# Altium footprint library ComputeCores.PCBLIB: 18 footprints (part 2 of 2)
Each footprint in its own frame and in the unit in brackets; x right, y up, seen from the top. Pads: shape width x height; smd on the part's side, far side on the other; paste and mask are expansions set on the pad; w line width, h text height; cw(c..) or ccw(c..) is an arc to the next point about the centre after c.
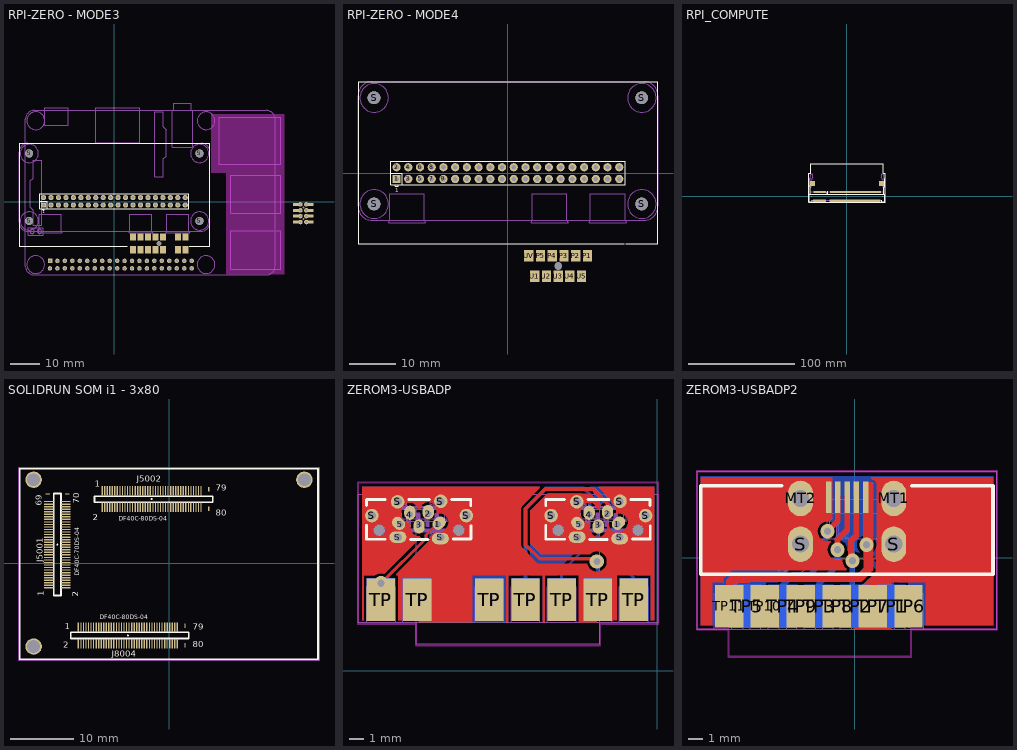
[diagram p1: the footprints below, top view; thin cyan lines are the x and y axes]

## RPI-ZERO - MODE3 [mil]
pads (117):
  rect 70x70 hole 39.37: 1(-949.27,-47.25)
  rect 60x60 hole 40: 1(-862.01,-795.39)
  round 70 hole 39.37: 2(-949.27,52.75) 3(-849.27,-47.25) 4(-849.27,52.75) 5(-749.27,-47.25) 6(-749.27,52.75) 7(-649.27,-47.25) 8(-649.27,52.75) 9(-549.27,-47.25) 10(-549.27,52.75) 11(-449.27,-47.25) 12(-449.27,52.75) 13(-349.27,-47.25) 14(-349.27,52.75) 15(-249.27,-47.25) 16(-249.27,52.75) 17(-149.27,-47.25) 18(-149.27,52.75) 19(-49.27,-47.25) 20(-49.27,52.75) 21(50.73,-47.25) 22(50.73,52.75) 23(150.73,-47.25) 24(150.73,52.75) 25(250.73,-47.25) 26(250.73,52.75) 27(350.73,-47.25) 28(350.73,52.75) 29(450.73,-47.25) 30(450.73,52.75) 31(550.73,-47.25) 32(550.73,52.75) 33(650.73,-47.25) 34(650.73,52.75) 35(750.73,-47.25) 36(750.73,52.75) 37(850.73,-47.25) 38(850.73,52.75) 39(950.73,-47.25) 40(950.73,52.75)
  round 60 hole 40: 2(-863.01,-895.39) 3(-763.01,-795.39) 4(-763.01,-895.39) 5(-663.01,-795.39) 6(-663.01,-895.39) 7(-563.01,-795.39) 8(-563.01,-895.39) 9(-463.01,-795.39) 10(-463.01,-895.39) 11(-363.01,-795.39) 12(-363.01,-895.39) 13(-263.01,-795.39) 14(-263.01,-895.39) 15(-163.01,-795.39) 16(-163.01,-895.39) 17(-63.01,-795.39) 18(-63.01,-895.39) 19(36.99,-795.39) 20(36.99,-895.39) 21(136.99,-795.39) 22(136.99,-895.39) 23(236.99,-795.39) 24(236.99,-895.39) 25(336.99,-795.39) 26(336.99,-895.39) 27(436.99,-795.39) 28(436.99,-895.39) 29(536.99,-795.39) 30(536.99,-895.39) 31(636.99,-795.39) 32(636.99,-895.39) 33(736.99,-795.39) 34(736.99,-895.39) 35(836.99,-795.39) 36(836.99,-895.39) 37(936.99,-795.39) 38(936.99,-895.39) 39(1036.99,-795.39) 40(1036.99,-895.39)
  rect 78.74x98.43 smd: P1(951.73,-645.25) P1(951.73,-475.25) P2(651.73,-475.25) P3(551.73,-475.25) P4(451.73,-475.25) P5(351.73,-475.25) P5(851.73,-645.25) P5(851.73,-475.25) U1(251.73,-645.25) U2(351.73,-645.25) U3(451.73,-645.25) U4(551.73,-645.25) U5(651.73,-645.25) UV(251.73,-475.25)
  round 60 hole 30: P1(2573.99,-274.61) P2(2573.99,-195.87) P3(2573.99,-117.13) P5(2573.99,-38.39) U1(2495.25,-274.61) U2(2495.25,-195.87) U3(2495.25,-117.13) U4(2495.25,-38.39)
  rect 78.74x40 smd: P1(2633.05,-274.61) U1(2436.2,-274.61) U2(2436.2,-195.87) U3(2436.2,-117.13) U4(2436.2,-38.39)
  rect 80x40 smd: P2(2633.05,-195.87) P3(2633.05,-117.13) P5(2633.05,-38.39)
  round 108.27 hole 108.27 unplated: S(-1141.73,-260.25) S(-1141.73,645.25) S(1141.73,-260.25) S(1141.73,645.25)
  round 0 hole 66.93 square unplated: SJ(600.23,-561.01)
  round 0 hole 27.56 unplated: SJE(2534.99,-234.39) SJE(2534.99,-77.39)
Top Overlay:
  lines w5: -999.27,2.75 -999.27,102.75 1000.73,102.75 1000.73,-97.25 -899.27,-97.25 ; -999.27,2.75 -999.27,-97.25 -961.77,-97.25 ; -999.27,2.75 -899.27,2.75 -899.27,-97.25 ; -961.77,-97.25 -936.77,-97.25 ; -961.77,-97.25 -961.77,-109.75 -936.77,-109.75 -936.77,-97.25 ; -936.77,-97.25 -899.27,-97.25
  lines w10: 170.73,-601.01 -1278.27,-601.01 -1278.27,783.99 1280.73,783.99 1280.73,-601.01 1006.73,-601.01
  text "1" at -961.77,-159.75 h34
Bottom Overlay:
  lines w5: -926.01,-944.39 -926.01,-786.39 -887.01,-747.39 1100.99,-747.39 1100.99,-944.39 -926.01,-944.39
  lines w5.91: 2469.99,-310.39 2469.99,0.61 2598.99,0.61 2598.99,-310.39 2469.99,-310.39
  lines w7.87: 2743.99,-337.39 2743.99,-927.39 2287.99,-927.39 2287.99,-968.39 1470.99,-968.39 1470.99,393.61 1301.99,393.61 1301.99,1173.61 2283.99,1173.61 2283.99,-337.39 2743.99,-337.39 ; 2743.99,-337.39 2743.99,-928.39 1482.99,-928.39 1482.99,-337.39 2743.99,-337.39
Keep-Out Layer:
  board cut-out: 1305.99,392.61 1305.99,1170.61 2275.99,1170.61 2275.99,-966.39 1506.99,-966.39 1506.99,392.61
Keep-Out Layer:
  lines w10: 1305.99,392.61 1305.99,1170.61 2275.99,1170.61 2275.99,-966.39 1506.99,-966.39 1506.99,392.61 1305.99,392.61 ; 1382.99,471.61 2262.99,471.61 2262.99,1141.61 2257.99,1146.61 1382.99,1146.61 1382.99,471.61 ; 1537.99,-928.39 2262.99,-928.39 2262.99,-378.39 1537.99,-378.39 1537.99,-928.39 ; 1537.99,-178.39 2257.99,-178.39 2257.99,376.61 1542.99,376.61 1537.99,371.61 1537.99,-178.39
Mechanical 15:
  circle w5: c-1054.01,1083.61 r120
  circle w5: c-1003.01,-400.39 r29
  circle w5: c-1103.01,-400.39 r29
  circle w5: c1229.99,1083.61 r119
  circle w5: c1229.99,-845.39 r119
  circle w5: c-1054.01,-845.39 r119
  lines w5: 776.99,1221.61 -1073.01,1221.61 ccw(c-1073.01,1102.61) -1192.01,1102.61 -1192.01,-865.39 ccw(c-1073.51,-864.89) -1073.01,-983.39 2036.99,-983.39 ccw(c2036.99,-865.39) 2154.99,-865.39 2154.99,1102.61 ccw(c2036.49,1103.11) 2036.99,1221.61 1052.99,1221.61 ; 776.99,1221.61 796.99,1221.61 ; 776.99,1221.61 776.99,728.61 1052.99,728.61 1052.99,1221.61 ; 796.99,1221.61 796.99,1320.04 1032.99,1320.04 1032.99,1221.61 ; 796.99,1221.61 1032.99,1221.61 ; 1032.99,1221.61 1052.99,1221.61 ; -1152.01,-452.39 -1152.01,-353.39 -955.01,-353.39 -955.01,-452.39 -1152.01,-452.39 ; -1129.01,-78.39 -1089.01,-117.39 -1089.01,-314.39 -971.01,-314.39 -971.01,551.61 -1089.01,551.61 -1089.01,315.61 -1129.01,276.61 -1129.01,-78.39 ; -932.01,1024.61 -617.01,1024.61 -617.01,1260.98 -932.01,1260.98 -932.01,1024.61 ; -247.01,787.61 343.99,787.61 343.99,1260.98 -247.01,1260.98 -247.01,787.61 ; 540.99,335.61 658.99,335.61 658.99,571.61 697.99,610.61 697.99,965.61 658.99,1004.61 658.99,1201.61 540.99,1201.61 540.99,335.61 ; 1406.99,500.61 2233.99,500.61 2233.99,1130.61 1406.99,1130.61 1406.99,500.61 ; 1563.99,-904.39 1563.99,-393.39 2146.99,-393.39 2233.99,-393.39 2233.99,-904.39 1563.99,-904.39 ; 1563.99,-156.39 2233.99,-156.39 2233.99,354.61 1563.99,354.61 1563.99,-156.39
Mechanical 30:
  circle w5: c-1140,-261.01 r122.05
  circle w5: c1143.46,-261.01 r122.05
  circle w5: c1143.46,644.5 r122.05
  circle w5: c-1140,644.5 r122.05
  lines w5: -1017.96,-418.5 -1008.11,-398.81 -1008.11,-172.43 -712.84,-172.43 -712.84,-398.81 -703,-418.5 -1017.96,-418.5 ; 198.58,-418.5 208.42,-398.81 208.42,-172.43 503.7,-172.43 503.7,-398.81 513.54,-418.5 198.58,-418.5 ; 694.64,-418.5 704.48,-398.81 704.48,-172.43 999.76,-172.43 999.76,-398.81 1009.6,-418.5 694.64,-418.5
  lines w10: 174.96,-398.81 208.42,-398.81 503.7,-398.81 ; 671.02,-398.81 704.48,-398.81 999.76,-398.81 ; -1277.8,-280.7 ccw(c-1159.69,-280.7) -1159.69,-398.81 -1008.11,-398.81 -712.84,-398.81 1163.14,-398.81 ccw(c1163.14,-280.69) 1281.26,-280.7 1281.26,664.18 ccw(c1163.14,664.17) 1163.14,782.29 -1159.69,782.29 ccw(c-1159.69,664.18) -1277.8,664.18 -1277.8,-280.7
3D body: height 354.33, standoff 0, extent 184.73,-591.01 1015.73,-531.01
3D body "usb3150.step": height 340.55, standoff 230.31, extent 207.22,-581.65 496.59,-249.77
3D body "pin_header_awl254-da-g40d.stp": height 315.46, standoff 0.5, extent -999.35,204.45 1000.65,711.54
3D body "female_header_a-bl254-da-g40d.stp": height 197.35, standoff -125.48, extent -1004.27,-56.01 1005.57,440.06
3D body "pizero_colored.step": height -215.22, standoff -390.42, extent -1278.33,-419.73 1280.73,784.99
3D body "usb3150.step": height 340.55, standoff 230.31, extent 703.28,-581.65 992.65,-249.77
3D body: height 354.33, standoff -59.06, extent 345.73,-591.01 854.73,-531.01
3D body: height 196.85, standoff 0, extent 1021.73,-380.25 1261.73,-140.25
3D body: height 196.85, standoff 0, extent -1261.73,525.26 -1021.73,765.26
3D body: height 196.85, standoff 0, extent -1261.72,-380.25 -1021.72,-140.25
3D body: height 196.85, standoff 0, extent 1021.73,525.26 1261.73,765.26
3D body: height 98.43, standoff 0, extent 211.73,-595.25 291.73,-589.88
3D body: height 98.43, standoff 0, extent 311.73,-595.25 391.73,-589.88
3D body: height 98.43, standoff 0, extent 411.73,-595.25 491.73,-589.88
3D body: height 98.43, standoff 0, extent 211.73,-530.25 291.73,-524.88
3D body: height 98.43, standoff 0, extent 311.73,-530.25 391.73,-524.88
3D body: height 98.43, standoff 0, extent 411.73,-530.25 491.73,-524.88
3D body: height 98.43, standoff 0, extent 511.73,-530.25 591.73,-524.88
3D body: height 98.43, standoff 0, extent 511.73,-595.25 591.73,-589.88
3D body: height 98.43, standoff 0, extent 811.73,-595.25 891.73,-589.88
3D body: height 98.43, standoff 0, extent 911.73,-595.25 991.73,-589.88
3D body: height 98.43, standoff 0, extent 811.73,-530.25 891.73,-524.88
3D body: height 98.43, standoff 0, extent 911.73,-530.25 991.73,-524.88
3D body: height 98.43, standoff 0, extent 611.73,-595.25 691.73,-589.88
3D body: height 98.43, standoff 0, extent 611.73,-530.25 691.73,-524.88
3D body "61304021821.stp": height 337.32, standoff -119.37, extent -924.69,-948.38 1094.99,-748.38

## RPI-ZERO - MODE4 [mil]
pads (56):
  rect 70x70 hole 39.37: 1(-949.27,-50.63)
  round 70 hole 39.37: 2(-949.27,49.37) 3(-849.27,-50.63) 4(-849.27,49.37) 5(-749.27,-50.63) 6(-749.27,49.37) 7(-649.27,-50.63) 8(-649.27,49.37) 9(-549.27,-50.63) 10(-549.27,49.37) 11(-449.27,-50.63) 12(-449.27,49.37) 13(-349.27,-50.63) 14(-349.27,49.37) 15(-249.27,-50.63) 16(-249.27,49.37) 17(-149.27,-50.63) 18(-149.27,49.37) 19(-49.27,-50.63) 20(-49.27,49.37) 21(50.73,-50.63) 22(50.73,49.37) 23(150.73,-50.63) 24(150.73,49.37) 25(250.73,-50.63) 26(250.73,49.37) 27(350.73,-50.63) 28(350.73,49.37) 29(450.73,-50.63) 30(450.73,49.37) 31(550.73,-50.63) 32(550.73,49.37) 33(650.73,-50.63) 34(650.73,49.37) 35(750.73,-50.63) 36(750.73,49.37) 37(850.73,-50.63) 38(850.73,49.37) 39(950.73,-50.63) 40(950.73,49.37)
  rect 78.74x98.43 smd: P1(678.82,-704.02) P2(579.25,-704.02) P3(479.25,-704.02) P4(379.25,-704.02) P5(279.25,-704.02) U1(229.29,-878.72) U2(329.29,-878.72) U3(429.29,-878.72) U4(529.29,-878.72) U5(629.29,-878.72) UV(179.25,-704.02)
  round 108.27 hole 108.27 unplated: S(-1141.73,-263.63) S(-1141.73,641.88) S(1141.73,-263.63) S(1141.73,641.88)
  round 0 hole 66.93 square unplated: SJ(430.51,-791.88)
Top Overlay:
  lines w5: -999.27,-0.63 -999.27,99.37 1000.73,99.37 1000.73,-100.63 -899.27,-100.63 ; -999.27,-0.63 -999.27,-100.63 -961.77,-100.63 ; -999.27,-0.63 -899.27,-0.63 -899.27,-100.63 ; -961.77,-100.63 -936.77,-100.63 ; -961.77,-100.63 -961.77,-113.13 -936.77,-113.13 -936.77,-100.63 ; -936.77,-100.63 -899.27,-100.63
  lines w10: 995,-604.38 -1278.27,-604.38 -1278.27,780.62 1280.73,780.62 1280.73,-604.38 1006.73,-604.38
  text "1" at -961.77,-163.13 h34
Mechanical 30:
  circle w5: c-1140,-264.39 r122.05
  circle w5: c1143.46,-264.39 r122.05
  circle w5: c1143.46,641.12 r122.05
  circle w5: c-1140,641.12 r122.05
  lines w5: -1017.96,-421.88 -1008.11,-402.19 -1008.11,-175.81 -712.84,-175.81 -712.84,-402.19 -703,-421.88 -1017.96,-421.88 ; 198.58,-421.88 208.42,-402.19 208.42,-175.81 503.7,-175.81 503.7,-402.19 513.54,-421.88 198.58,-421.88 ; 694.64,-421.88 704.48,-402.19 704.48,-175.81 999.76,-175.81 999.76,-402.19 1009.6,-421.88 694.64,-421.88
  lines w10: 174.96,-402.19 208.42,-402.19 503.7,-402.19 ; 671.02,-402.19 704.48,-402.19 999.76,-402.19 ; -1277.8,-284.08 ccw(c-1159.69,-284.08) -1159.69,-402.19 -1008.11,-402.19 -712.84,-402.19 1163.14,-402.19 ccw(c1163.14,-284.07) 1281.26,-284.08 1281.26,660.8 ccw(c1163.14,660.8) 1163.14,778.91 -1159.69,778.91 ccw(c-1159.69,660.8) -1277.8,660.8 -1277.8,-284.08
3D body "pin_header_awl254-da-g40d.stp": height 315.46, standoff 0.5, extent -999.35,201.07 1000.65,708.16
3D body "female_header_a-bl254-da-g40d.stp": height 197.35, standoff -125.48, extent -1004.27,-59.38 1005.57,436.68
3D body "pizero_colored.step": height -215.22, standoff -390.42, extent -1278.33,-423.11 1280.73,781.62
3D body: height 196.85, standoff 0, extent 1021.73,-383.63 1261.73,-143.63
3D body: height 196.85, standoff 0, extent -1261.73,521.88 -1021.73,761.88
3D body: height 196.85, standoff 0, extent -1261.72,-383.63 -1021.72,-143.63
3D body: height 196.85, standoff 0, extent 1021.73,521.88 1261.73,761.88
3D body: height 98.43, standoff 0, extent 190.35,-830.85 270.35,-825.47
3D body: height 98.43, standoff 0, extent 290.35,-830.85 370.35,-825.47
3D body: height 98.43, standoff 0, extent 390.35,-830.85 470.35,-825.47
3D body: height 98.43, standoff 0, extent 139.84,-761.14 219.84,-755.76
3D body: height 98.43, standoff 0, extent 238.9,-761.65 318.9,-756.28
3D body: height 98.43, standoff 0, extent 338.5,-761.65 418.5,-756.28
3D body: height 98.43, standoff 0, extent 438.98,-760.68 518.98,-755.3
3D body: height 98.43, standoff 0, extent 490.35,-830.85 570.35,-825.47
3D body: height 98.43, standoff 0, extent 639.33,-760.68 719.33,-755.3
3D body: height 98.43, standoff 0, extent 590.35,-830.85 670.35,-825.47
3D body: height 98.43, standoff 0, extent 539.77,-760.17 619.77,-754.79
3D body: height 354.33, standoff -59.06, extent 176.01,-821.88 685.01,-761.88
3D body "USB-RAPSBERRY.step": height 438.37, standoff -75.68, extent -63.74,-826.41 767.28,-251.05

## RPI_COMPUTE [mm]
pads (204):
  round 1.1 hole 1.1: 1(-33.13,0)
  rect 0.35x2 smd: 1(-31.38,-4.1) 2(-31.08,4.1) 3(-30.78,-4.1) 4(-30.48,4.1) 5(-30.18,-4.1) 6(-29.88,4.1) 7(-29.58,-4.1) 8(-29.28,4.1) 9(-28.98,-4.1) 10(-28.68,4.1) 11(-28.38,-4.1) 12(-28.08,4.1) 13(-27.78,-4.1) 14(-27.48,4.1) 15(-27.18,-4.1) 16(-26.88,4.1) 17(-26.58,-4.1) 18(-26.28,4.1) 19(-25.98,-4.1) 20(-25.68,4.1) 21(-25.38,-4.1) 22(-25.08,4.1) 23(-24.78,-4.1) 24(-24.48,4.1) 25(-24.18,-4.1) 26(-23.88,4.1) 27(-23.58,-4.1) 28(-23.28,4.1) 29(-22.98,-4.1) 30(-22.68,4.1) 31(-22.38,-4.1) 32(-22.08,4.1) 33(-21.78,-4.1) 34(-21.48,4.1) 35(-21.18,-4.1) 36(-20.88,4.1) 37(-20.58,-4.1) 38(-20.28,4.1) 39(-19.98,-4.1) 40(-19.68,4.1) 41(-15.78,-4.1) 42(-15.48,4.1) 43(-15.18,-4.1) 44(-14.88,4.1) 45(-14.58,-4.1) 46(-14.28,4.1) 47(-13.98,-4.1) 48(-13.68,4.1) 49(-13.38,-4.1) 50(-13.08,4.1) 51(-12.78,-4.1) 52(-12.48,4.1) 53(-12.18,-4.1) 54(-11.88,4.1) 55(-11.58,-4.1) 56(-11.28,4.1) 57(-10.98,-4.1) 58(-10.68,4.1) 59(-10.38,-4.1) 60(-10.08,4.1) 61(-9.78,-4.1) 62(-9.48,4.1) 63(-9.18,-4.1) 64(-8.88,4.1) 65(-8.58,-4.1) 66(-8.28,4.1) 67(-7.98,-4.1) 68(-7.68,4.1) 69(-7.38,-4.1) 70(-7.08,4.1) 71(-6.78,-4.1) 72(-6.48,4.1) 73(-6.18,-4.1) 74(-5.88,4.1) 75(-5.58,-4.1) 76(-5.28,4.1) 77(-4.98,-4.1) 78(-4.68,4.1) 79(-4.38,-4.1) 80(-4.08,4.1) 81(-3.78,-4.1) 82(-3.48,4.1) 83(-3.18,-4.1) 84(-2.88,4.1) 85(-2.58,-4.1) 86(-2.28,4.1) 87(-1.98,-4.1) 88(-1.68,4.1) 89(-1.38,-4.1) 90(-1.08,4.1) 91(-0.78,-4.1) 92(-0.48,4.1) 93(-0.18,-4.1) 94(0.12,4.1) 95(0.42,-4.1) 96(0.72,4.1) 97(1.02,-4.1) 98(1.32,4.1) 99(1.62,-4.1) 100(1.92,4.1) 101(2.22,-4.1) 102(2.52,4.1) 103(2.82,-4.1) 104(3.12,4.1) 105(3.42,-4.1) 106(3.72,4.1) 107(4.02,-4.1) 108(4.32,4.1) 109(4.62,-4.1) 110(4.92,4.1) 111(5.22,-4.1) 112(5.52,4.1) 113(5.82,-4.1) 114(6.12,4.1) 115(6.42,-4.1) 116(6.72,4.1) 117(7.02,-4.1) 118(7.32,4.1) 119(7.62,-4.1) 120(7.92,4.1) 121(8.22,-4.1) 122(8.52,4.1) 123(8.82,-4.1) 124(9.12,4.1) 125(9.42,-4.1) 126(9.72,4.1) 127(10.02,-4.1) 128(10.32,4.1) 129(10.62,-4.1) 130(10.92,4.1) 131(11.22,-4.1) 132(11.52,4.1) 133(11.82,-4.1) 134(12.12,4.1) 135(12.42,-4.1) 136(12.72,4.1) 137(13.02,-4.1) 138(13.32,4.1) 139(13.62,-4.1) 140(13.92,4.1) 141(14.22,-4.1) 142(14.52,4.1) 143(14.82,-4.1) 144(15.12,4.1) 145(15.42,-4.1) 146(15.72,4.1) 147(16.02,-4.1) 148(16.32,4.1) 149(16.62,-4.1) 150(16.92,4.1) 151(17.22,-4.1) 152(17.52,4.1) 153(17.82,-4.1) 154(18.12,4.1) 155(18.42,-4.1) 156(18.72,4.1) 157(19.02,-4.1) 158(19.32,4.1) 159(19.62,-4.1) 160(19.92,4.1) 161(20.22,-4.1) 162(20.52,4.1) 163(20.82,-4.1) 164(21.12,4.1) 165(21.42,-4.1) 166(21.72,4.1) 167(22.02,-4.1) 168(22.32,4.1) 169(22.62,-4.1) 170(22.92,4.1) 171(23.22,-4.1) 172(23.52,4.1) 173(23.82,-4.1) 174(24.12,4.1) 175(24.42,-4.1) 176(24.72,4.1) 177(25.02,-4.1) 178(25.32,4.1) 179(25.62,-4.1) 180(25.92,4.1) 181(26.22,-4.1) 182(26.52,4.1) 183(26.82,-4.1) 184(27.12,4.1) 185(27.42,-4.1) 186(27.72,4.1) 187(28.02,-4.1) 188(28.32,4.1) 189(28.62,-4.1) 190(28.92,4.1) 191(29.22,-4.1) 192(29.52,4.1) 193(29.82,-4.1) 194(30.12,4.1) 195(30.42,-4.1) 196(30.72,4.1) 197(31.02,-4.1) 198(31.32,4.1) 199(31.62,-4.1) 200(31.92,4.1)
  round 0.6 hole 0.6: 1(33.67,0)
  rect 4.5x4.6 smd: M1(-32.28,12) M2(32.82,12)
Top Overlay:
  region: 0,0 0.254,0 0.254,0.254 0,0.254
  lines w0.127: -35.56,-5.715 36.195,-5.715 36.195,21.59 34.29,21.59 34.29,30.48 -33.655,30.48 -33.655,21.59 -35.56,21.59 -35.56,-5.715
  lines w0.203: -35.38,16.35 -35.38,9.9 -34.23,8.55 -34.23,1.85 ; -32.38,-3.8 -32.38,-4.9 -35.18,-4.9 -35.18,1.75 35.72,1.75 35.72,-4.9 32.92,-4.9 32.92,-3.8 ; -18.53,1.85 -18.53,3.85 cw(c-18.18,3.825) -17.83,3.85 -17.83,1.85 ; 34.77,1.85 34.77,8.55 35.92,9.9 35.92,16.35
Mechanical 16:
  lines w0.203: -34.13,4.4 34.67,4.4 ; -33.98,8.45 cw(c53.76,6.921) -33.48,16.4 ; -32.38,-3.8 32.92,-3.8 ; 34.52,8.45 ccw(c-53.22,6.921) 34.02,16.4 ; -33.48,16.4 -34.18,16.55 -33.83,20.2 cw(c-32.929,19.968) -32.08,20.35 cw(c-36.93,18.8) -31.88,18.15 -32.48,18.35 ccw(c-32.525,18.198) -32.58,18.05 -31.98,17.85 -32.58,16.25 -33.48,16.4 ; 34.02,16.4 34.72,16.55 34.37,20.2 ccw(c33.469,19.968) 32.62,20.35 ccw(c37.47,18.8) 32.42,18.15 33.02,18.35 cw(c33.065,18.198) 33.12,18.05 32.52,17.85 33.12,16.25 34.02,16.4
3D body: height 4.32, standoff 3.81, extent -21.184,12.776 -9.957,23.647
3D body: height 4.32, standoff 3.81, extent 3.023,12.446 15.545,24.867
3D body "computeModule.stp": height 4.31, standoff 2.81, extent -33.462,0.353 34.138,30.353
3D body "c-1565917-4-d1-3d.stp": height 5.5, standoff -0.68, extent -35.458,-5.08 36.042,21.475

## SOLIDRUN SOM i1 - 3x80 [mm]
pads (239):
  rect 0.2x1.5 smd mask+0.05: A1(-10.54,11.42) A2(-10.54,8.78) A3(-10.14,11.42) A4(-10.14,8.78) A5(-9.74,11.42) A6(-9.74,8.78) A7(-9.34,11.42) A8(-9.34,8.78) A9(-8.94,11.42) A10(-8.94,8.78) A11(-8.54,11.42) A12(-8.54,8.78) A13(-8.14,11.42) A14(-8.14,8.78) A15(-7.74,11.42) A16(-7.74,8.78) A17(-7.34,11.42) A18(-7.34,8.78) A19(-6.94,11.42) A20(-6.94,8.78) A21(-6.54,11.42) A22(-6.54,8.78) A23(-6.14,11.42) A24(-6.14,8.78) A25(-5.74,11.42) A26(-5.74,8.78) A27(-5.34,11.42) A28(-5.34,8.78) A29(-4.94,11.42) A30(-4.94,8.78) A31(-4.54,11.42) A32(-4.54,8.78) A33(-4.14,11.42) A34(-4.14,8.78) A35(-3.74,11.42) A36(-3.74,8.78) A37(-3.34,11.42) A38(-3.352,8.78) A39(-2.94,11.42) A40(-2.94,8.78) A41(-2.54,11.42) A42(-2.54,8.78) A43(-2.14,11.42) A44(-2.14,8.78) A45(-1.74,11.42) A46(-1.74,8.78) A47(-1.34,11.42) A48(-1.34,8.78) A49(-0.94,11.42) A50(-0.94,8.78) A51(-0.54,11.42) A52(-0.54,8.78) A53(-0.14,11.42) A54(-0.14,8.78) A55(0.26,11.42) A56(0.26,8.78) A57(0.66,11.42) A58(0.66,8.78) A59(1.06,11.42) A60(1.06,8.78) A61(1.46,11.42) A62(1.46,8.78) A63(1.86,11.42) A64(1.86,8.78) A65(2.26,11.42) A66(2.26,8.78) A67(2.66,11.42) A68(2.66,8.78) A69(3.06,11.42) A70(3.06,8.78) A71(3.46,11.42) A72(3.437,8.78) A73(3.86,11.42) A74(3.86,8.78) A75(4.26,11.42) A76(4.26,8.78) A77(4.66,11.42) A78(4.66,8.78) A79(5.06,11.42) A80(5.06,8.78) B1(-14.29,-10.08) B2(-14.29,-12.72) B3(-13.89,-10.08) B4(-13.89,-12.72) B5(-13.49,-10.08) B6(-13.49,-12.72) B7(-13.09,-10.08) B8(-13.09,-12.72) B9(-12.69,-10.08) B10(-12.69,-12.72) B11(-12.29,-10.08) B12(-12.29,-12.72) B13(-11.89,-10.08) B14(-11.89,-12.72) B15(-11.49,-10.08) B16(-11.49,-12.72) B17(-11.09,-10.08) B18(-11.09,-12.72) B19(-10.69,-10.08) B20(-10.69,-12.72) B21(-10.29,-10.08) B22(-10.29,-12.72) B23(-9.89,-10.08) B24(-9.89,-12.72) B25(-9.49,-10.08) B26(-9.49,-12.72) B27(-9.09,-10.08) B28(-9.09,-12.72) B29(-8.69,-10.08) B30(-8.69,-12.72) B31(-8.29,-10.08) B32(-8.29,-12.72) B33(-7.89,-10.08) B34(-7.89,-12.72) B35(-7.49,-10.08) B36(-7.49,-12.72) B37(-7.09,-10.08) B38(-7.102,-12.72) B39(-6.69,-10.08) B40(-6.69,-12.72) B41(-6.29,-10.08) B42(-6.29,-12.72) B43(-5.89,-10.08) B44(-5.89,-12.72) B45(-5.49,-10.08) B46(-5.49,-12.72) B47(-5.09,-10.08) B48(-5.09,-12.72) B49(-4.69,-10.08) B50(-4.69,-12.72) B51(-4.29,-10.08) B52(-4.29,-12.72) B53(-3.89,-10.08) B54(-3.89,-12.72) B55(-3.49,-10.08) B56(-3.49,-12.72) B57(-3.09,-10.08) B58(-3.09,-12.72) B59(-2.69,-10.08) B60(-2.69,-12.72) B61(-2.29,-10.08) B62(-2.29,-12.72) B63(-1.89,-10.08) B64(-1.89,-12.72) B65(-1.49,-10.08) B66(-1.49,-12.72) B67(-1.09,-10.08) B68(-1.09,-12.72) B69(-0.69,-10.08) B70(-0.69,-12.72) B71(-0.29,-10.08) B72(-0.313,-12.72) B73(0.11,-10.08) B74(0.11,-12.72) B75(0.51,-10.08) B76(0.51,-12.72) B77(0.91,-10.08) B78(0.91,-12.72) B79(1.31,-10.08) B80(1.31,-12.72)
  rect 1.5x0.2 smd mask+0.05: C1(-18.927,-3.9) C2(-16.287,-3.9) C3(-18.927,-3.5) C4(-16.287,-3.5) C5(-18.927,-3.1) C6(-16.287,-3.1) C7(-18.927,-2.7) C8(-16.287,-2.7) C9(-18.927,-2.3) C10(-16.287,-2.3) C11(-18.927,-1.9) C12(-16.287,-1.9) C13(-18.927,-1.5) C14(-16.287,-1.5) C15(-18.927,-1.1) C16(-16.287,-1.1) C17(-18.927,-0.7) C18(-16.287,-0.7) C19(-18.927,-0.3) C20(-16.287,-0.3) C21(-18.927,0.1) C22(-16.287,0.1) C23(-18.927,0.5) C24(-16.287,0.5) C25(-18.927,0.9) C26(-16.287,0.9) C27(-18.927,1.3) C28(-16.287,1.3) C29(-18.927,1.7) C30(-16.287,1.7) C31(-18.927,2.1) C32(-16.287,2.1) C33(-18.927,2.5) C34(-16.287,2.5) C35(-18.927,2.9) C36(-16.287,2.9) C37(-18.927,3.3) C38(-16.287,3.288) C39(-18.927,3.7) C40(-16.287,3.7) C41(-18.927,4.1) C42(-16.287,4.1) C43(-18.927,4.5) C44(-16.287,4.5) C45(-18.927,4.9) C46(-16.287,4.9) C47(-18.927,5.3) C48(-16.287,5.3) C49(-18.927,5.7) C50(-16.287,5.7) C51(-18.927,6.1) C52(-16.287,6.1) C53(-18.927,6.5) C54(-16.287,6.5) C55(-18.927,6.9) C56(-16.287,6.9) C57(-18.927,7.3) C58(-16.287,7.3) C59(-18.927,7.7) C60(-16.287,7.7) C61(-18.927,8.1) C62(-16.287,8.1) C63(-18.927,8.5) C64(-16.287,8.5) C65(-18.927,8.9) C66(-16.287,8.9) C67(-18.927,9.3) C68(-16.287,9.3) C69(-18.927,9.7) C70(-16.287,9.7)
  round 2.6 hole 2: ""(-21.35,-13.15) ""(-21.35,13.15) ""(21.35,13.15)
  rect 0.7x0.2 smd mask+0.05: ""(-19.147,10.9) ""(-16.067,10.9)
  rect 0.2x0.7 smd mask+0.05: ""(2.51,-12.94) ""(2.51,-9.86) ""(6.26,8.56) ""(6.26,11.64)
Top Overlay:
  circle w0.254: c-6.481,-11.4 r0.025
  circle w0.254: c-17.611,2.91 r0.025
  circle w0.254: c-2.74,10.1 r0.025
  lines w0.254: -23.565,14.875 23.5,14.875 23.5,-15.125 ; -23.55,-15.15 23.5,-15.15 ; -23.55,-15.125 -23.55,14.85 ; -18.182,-5.1 -18.182,10.985 -17.032,10.985 -17.032,-5.1 -18.182,-5.1 ; -15.49,-11.88 -15.49,-10.88 3.135,-10.88 3.135,-11.88 -15.49,-11.88 ; -11.74,9.62 6.885,9.62 6.885,10.57 -11.74,10.57 -11.74,9.62
  text "79" at 3.735,-10.475 h1
  text "80" at 3.735,-13.3 h1
  text "2" at -16.69,-13.375 h1
  text "1" at -16.415,-10.45 h1
  text "DF40C-80DS-04" at -10.919,-8.879 h0.7
  text "J5002" at -5.05,12.8 h1
  text "1" at -11.69,12.045 h1
  text "2" at -11.99,6.77 h1
  text "80" at 7.41,7.495 h1
  text "79" at 7.41,11.42 h1
  text "DF40C-70DS-04" at -14.165,-2.005 h0.7
  text "1" at -19.715,-5.205 h1
  text "2" at -14.315,-5.33 h1
  text "70" at -14.14,9.37 h1
  text "69" at -20.09,9.07 h1
  text "DF40C-80DS-04" at -7.94,6.72 h0.7
  text "J8004" at -9,-14.725 h1
  text "J5001" at -19.9,0.15 h1
Mechanical 4:
  lines w0.254: -23.65,-15.275 23.65,-15.275 23.65,15 -23.65,15 -23.65,-15.275
3D body "DF40C-80DP.stp": height 1.54, standoff 0.4, extent -11.496,8.585 6.024,11.555
3D body "DF40C-80DP.stp": height 1.54, standoff 0.4, extent -15.256,-12.904 2.264,-9.934
3D body "DF40C-70DS.stp": height 1.46, standoff 0.01, extent -19.263,-5.396 -15.883,11.204
3D body "DF40C-80DS.stp": height 1.46, standoff 0.01, extent -12.036,8.38 6.564,11.76
3D body "DF40C-80DS.stp": height 1.46, standoff 0.01, extent -15.796,-13.109 2.804,-9.729
3D body "DF40C-70DP.stp": height 1.54, standoff 0.4, extent -19.058,-4.856 -16.088,10.664
3D body: height 4, standoff 3.15, extent 8.449,-15.127 18.685,-1.665
3D body: height 5.2, standoff 3.15, extent 18.945,-6.781 23.397,-2.346
3D body: height 5.2, standoff 3.15, extent 18.996,0.991 23.447,5.426
3D body: height 4, standoff 3.15, extent 18.955,7.372 21.793,10.074
3D body: height 4, standoff 3.15, extent 19.412,-10.281 22.25,-7.579
3D body: height 4, standoff 3.15, extent 8.372,1.027 18.609,14.489
3D body: height 4, standoff 3.15, extent -22.654,3.906 -14.78,12.737
3D body: height 5, standoff 3.15, extent -14.589,-15.029 6.975,5.828
3D body: height 4, standoff 3.15, extent -23.416,-10.013 -14.703,-1.894
3D body: height 4, standoff 3.15, extent -7.692,6.194 -0.684,12.828
3D body: height 3.15, standoff 1.55, extent -23.543,-15.102 23.473,14.87
3D body: height -1, standoff -2, extent 8.372,1.027 18.609,14.489
3D body: height -1, standoff -2, extent 8.474,-15.153 18.71,-1.691

## ZEROM3-USBADP [mm]
pads (40):
  oval 0.8x1 hole 0.45 copper offset 0.09,0.09 rot 135: 1(-15.437,10.285) 1(-2.824,10.285)
  oval 0.8x1 hole 0.45 copper offset 0,0.127: 2(-16.117,11.028) 2(-3.504,11.028) 4(-17.41,10.978) 4(-4.797,10.978)
  oval 0.8x1 hole 0.45 copper offset 0,-0.127: 3(-16.767,10.275) 3(-4.154,10.255)
  oval 0.8x1 hole 0.45 copper offset -0.111,0.069 rot 45: 5(-18.097,10.285) 5(-5.484,10.285)
  round 0 hole 0.8: MT1(-19.577,9.885) MT1(-6.964,9.885) MT2(-13.977,9.885) MT2(-1.364,9.885)
  round 0.95 hole 0.55: S(-20.087,10.905) S(-13.437,10.905) S(-7.474,10.905) S(-0.824,10.905)
  oval 1.2x0.8 hole 0.55: S(-18.257,9.385) S(-5.644,9.385)
  round 0.95 hole 0.55 copper offset -0.02,-0.02: S(-18.257,11.895) S(-5.644,11.895)
  oval 1.2x0.8 hole 0.55 copper offset 0,-0.1: S(-15.267,9.385) S(-2.654,9.385)
  round 0.95 hole 0.55 copper offset 0.02,0.02: S(-15.257,11.895) S(-2.644,11.895)
  rect 2x3 smd: TP(-19.447,4.989) TP(-16.907,4.989) TP(-11.817,4.989) TP(-9.277,4.989) TP(-6.737,4.989) TP(-4.19,4.98) TP(-1.657,4.989)
  rect 2x3 smd far side: TP(-19.447,4.989) TP(-16.907,4.989) TP(-11.817,4.989) TP(-9.277,4.989) TP(-6.737,4.989) TP(-4.197,4.989) TP(-1.657,4.989)
via -4.257,7.675 diameter 1 hole 0.5
via -19.447,6.145 diameter 1 hole 0.5
Top Layer:
  region: 190 vertices and 0 holes, not listed, extent -20.775,3.394 -0.235,12.943
  lines w0.2: -19.447,4.989 -19.447,6.145 -16.289,9.303 -16.289,9.536 -15.54,10.285 -15.437,10.285
  lines w0.254: -4.257,7.675 -4.439,7.858 -8.274,7.858 -9.277,8.86 -9.277,11.377 -7.879,12.775 -4.531,12.775 -3.504,11.748 -3.504,11.028
Bottom Layer:
  region: -0.235,3.553 -0.457,3.553 -0.457,6.689 -1.399,6.689 -1.441,6.752 -3.313,8.624 -3.313,9.393 -2.979,9.727 -2.805,9.692 -2.571,9.739 -2.372,9.872 -2.231,10.013 -2.098,10.211 -2.052,10.446 -2.098,10.68 -2.231,10.878 -2.429,11.011 -2.663,11.057 -2.795,11.031 -2.808,11.034 -2.892,11.114 -2.892,11.255 -2.939,11.489 -3.071,11.687 -3.27,11.82 -3.504,11.867 -3.738,11.82 -3.937,11.687 -4.069,11.489 -4.104,11.312 -4.206,11.312 -4.231,11.439 -4.364,11.637 -4.433,11.684 -4.433,12.4 -4.458,12.528 -4.531,12.636 -4.745,12.85 -4.707,12.943 -0.235,12.943
  region: -5.1,12.262 -5.1,11.724 -5.229,11.637 -5.362,11.439 -5.408,11.205 -5.408,11.005 -5.362,10.771 -5.229,10.572 -5.031,10.44 -4.833,10.4 -4.75,10.308 -4.766,10.228 -4.766,10.028 -4.719,9.794 -4.587,9.595 -4.58,9.531 -6.953,7.158 -7.019,7.059 -7.043,6.942 -7.043,6.689 -7.937,6.689 -7.937,3.394 -8.077,3.394 -8.077,6.689 -8.943,6.689 -8.943,11.239 -7.703,12.479 -5.317,12.479
  region: -8.275,12.85 -9.513,11.613 -9.585,11.505 -9.61,11.377 -9.61,6.689 -10.477,6.689 -10.477,3.394 -16.73,3.394 -16.782,3.471 -16.873,3.532 -16.98,3.553 -18.247,3.553 -18.247,6.689 -18.339,6.689 -18.378,6.781 -16.073,9.086 -16.006,9.185 -15.983,9.303 -15.983,9.409 -15.653,9.74 -15.652,9.739 -15.418,9.692 -15.184,9.739 -14.985,9.872 -14.844,10.013 -14.711,10.211 -14.665,10.446 -14.711,10.68 -14.844,10.878 -15.042,11.011 -15.277,11.057 -15.408,11.031 -15.421,11.034 -15.505,11.114 -15.505,11.255 -15.552,11.489 -15.684,11.687 -15.883,11.82 -16.117,11.867 -16.351,11.82 -16.55,11.687 -16.682,11.489 -16.717,11.312 -16.819,11.312 -16.844,11.439 -16.977,11.637 -17.176,11.77 -17.41,11.817 -17.644,11.77 -17.842,11.637 -17.975,11.439 -18.021,11.205 -18.021,11.005 -17.975,10.771 -17.842,10.572 -17.644,10.44 -17.45,10.401 -17.367,10.307 -17.379,10.248 -17.379,10.048 -17.332,9.814 -17.2,9.615 -17.001,9.483 -16.767,9.436 -16.72,9.446 -16.671,9.353 -19.217,6.807 -19.264,6.827 -19.447,6.851 -19.63,6.827 -19.8,6.756 -19.887,6.689 -20.647,6.689 -20.647,3.553 -20.775,3.553 -20.775,12.943 -8.314,12.943
  lines w0.2: -19.447,6.145 -16.289,9.303 -16.289,9.536 -15.54,10.285 -15.437,10.285 ; -6.737,4.989 -6.737,6.942 -4.154,9.525 -4.154,10.255 ; -2.824,10.285 -2.854,10.285 -3.619,9.52 -3.619,8.498 -1.657,6.535 -1.657,4.989
  lines w0.254: -9.277,4.989 -9.277,11.377 -7.842,12.813 -5.179,12.813 -4.767,12.4 -4.767,11.008 -4.797,10.978 ; -4.257,7.675 -4.197,7.615 -4.197,4.989
Top Overlay:
  lines w0.2: -20.467,10.225 -20.467,9.235 -19.157,9.235 ; -20.467,11.605 -20.467,12.035 -19.147,12.035 ; -17.486,12.045 -16.027,12.035 ; -17.377,9.215 -16.137,9.215 ; -14.489,12.035 -13.127,12.035 -13.127,11.613 ; -14.362,9.245 -13.117,9.245 -13.117,10.19 ; -7.854,10.225 -7.854,9.235 -6.544,9.235 ; -7.854,11.605 -7.854,12.035 -6.534,12.035 ; -4.873,12.045 -3.414,12.035 ; -4.764,9.215 -3.524,9.215 ; -1.876,12.035 -0.514,12.035 -0.514,11.613 ; -1.749,9.245 -0.504,9.245 -0.504,10.19
Keep-Out Layer:
  lines w0.15: -21.055,3.273 -16.98,3.273 -16.98,1.773 -4.03,1.773 -4.03,3.273 0.045,3.273 0.045,13.223 -21.055,13.223 -21.055,3.273
Mechanical 26:
  drawing of 2381 lines, arcs and shapes, not listed

## ZEROM3-USBADP2 [mm]
pads (20):
  rect 0.4x2.2 smd: 1(0.782,4.261) 2(0.132,4.261) 3(-0.518,4.261) 4(-1.168,4.261) 5(-1.818,4.261)
  oval 1.75x2.5 hole 1.2: MT1(2.763,4.185) MT2(-3.799,4.184) S(-3.799,0.963) S(2.763,0.963)
  rect 2x3 smd far side: TP1(2.585,-3.4) TP2(0.045,-3.4) TP3(-2.495,-3.4) TP4(-5.035,-3.4) TP5(-7.575,-3.4)
  rect 2x3 smd: TP6(3.8,-3.4) TP7(1.275,-3.4) TP8(-1.25,-3.4) TP9(-3.775,-3.4) TP10(-6.3,-3.4) TP11(-8.825,-3.4)
via -0.15,-0.2 diameter 1 hole 0.5
via 0.85,0.925 diameter 1 hole 0.5
via -1.201,0.575 diameter 1 hole 0.5
via -1.903,1.875 diameter 1 hole 0.5
Top Layer:
  region: 9.745,-4.741 5,-4.741 5,-1.7 2.6,-1.7 2.6,-5.022 -0.05,-5.022 -0.05,-1.908 0.4,-1.908 0.556,-1.877 0.688,-1.788 1.413,-1.063 1.502,-0.931 1.533,-0.775 1.533,0.749 1.553,0.898 1.558,0.925 1.558,5.15 1.527,5.306 1.438,5.438 1.306,5.527 1.271,5.534 1.182,5.561 1.187,5.658 9.745,5.658
  region: -1.568,5.561 -1.568,4.3 -1.576,4.261 -1.576,2.778 -1.789,2.566 -1.903,2.581 -2.086,2.557 -2.256,2.486 -2.402,2.374 -2.514,2.228 -2.585,2.058 -2.609,1.875 -2.585,1.692 -2.514,1.522 -2.402,1.376 -2.256,1.264 -2.086,1.193 -1.903,1.169 -1.72,1.193 -1.698,1.202 -1.647,1.115 -1.7,1.074 -1.812,0.928 -1.883,0.758 -1.907,0.575 -1.883,0.392 -1.812,0.222 -1.7,0.076 -1.554,-0.036 -1.384,-0.107 -1.201,-0.131 -1.018,-0.107 -0.94,-0.075 -0.849,-0.145 -0.856,-0.2 -0.832,-0.383 -0.761,-0.553 -0.649,-0.699 -0.561,-0.767 -0.595,-0.867 -8.5,-0.867 -8.656,-0.898 -8.788,-0.987 -9.113,-1.312 -9.202,-1.444 -9.233,-1.6 -9.233,-1.7 -10.025,-1.7 -10.025,-4.741 -10.801,-4.741 -10.801,5.658 -1.574,5.658
  lines w0.2: 0.782,0.993 0.85,0.925
  lines w0.4: -1.903,1.875 -1.168,2.61 -1.168,4.261 ; -1.201,0.575 -1.201,1.304 -0.518,1.987 -0.518,4.261 ; -0.15,-0.2 -0.25,-0.1 -0.25,1.175 0.132,1.557 0.132,4.261 ; 0.782,0.993 0.782,4.261 0.782,5.15 1.15,5.15 1.15,0.925 1.125,0.925 ; 1.125,0.925 0.85,0.925 0.85,-0.75 0.325,-1.275 -8.5,-1.275 -8.825,-1.6 -8.825,-3.4 -8.45,-3.025 -8.45,-1.725 -8.28,-1.555 -7.52,-1.555 -7.466,-1.5 0.4,-1.5 1.125,-0.775 1.125,0.925
Bottom Layer:
  region: 9.745,-4.741 4.2,-4.741 4.093,-4.763 4.002,-4.823 3.941,-4.914 3.938,-4.931 3.785,-4.931 3.785,-1.7 3.061,-1.7 2.993,-1.635 2.962,-1.479 2.873,-1.347 1.265,0.262 1.269,0.364 1.349,0.426 1.461,0.572 1.532,0.742 1.556,0.925 1.532,1.108 1.461,1.278 1.349,1.424 1.203,1.536 1.033,1.607 0.85,1.631 0.667,1.607 0.497,1.536 0.351,1.424 0.239,1.278 0.168,1.108 0.144,0.925 0.168,0.742 0.239,0.572 0.351,0.426 0.369,0.412 0.369,0.411 0.369,0.41 0.257,0.37 0.203,0.411 0.033,0.482 -0.15,0.506 -0.333,0.482 -0.411,0.45 -0.502,0.52 -0.495,0.575 -0.519,0.758 -0.59,0.928 -0.702,1.074 -0.848,1.187 -1.018,1.257 -1.201,1.281 -1.384,1.257 -1.406,1.248 -1.457,1.335 -1.404,1.376 -1.291,1.522 -1.221,1.692 -1.197,1.875 -1.221,2.058 -1.291,2.228 -1.404,2.374 -1.55,2.486 -1.72,2.557 -1.903,2.581 -2.086,2.557 -2.256,2.486 -2.402,2.374 -2.514,2.228 -2.585,2.058 -2.609,1.875 -2.585,1.692 -2.514,1.522 -2.467,1.46 -2.563,1.363 -2.652,1.231 -2.683,1.075 -2.683,-0.156 -3.294,-0.767 -4.325,-0.767 -4.481,-0.798 -4.613,-0.887 -5.323,-1.597 -5.392,-1.7 -6.235,-1.7 -6.235,-4.931 -8.827,-4.931 -8.831,-4.914 -8.891,-4.823 -8.982,-4.763 -9.09,-4.741 -10.801,-4.741 -10.801,5.749 9.745,5.749
  lines w0.4: -5.035,-3.4 -5.035,-1.885 -4.325,-1.175 -3.125,-1.175 -2.275,-0.325 -2.275,1.075 -1.903,1.447 -1.903,1.875 ; -2.495,-3.4 -2.495,-1.82 -1.201,-0.526 -1.201,0.575 ; -0.15,-0.2 -0.15,-3.205 0.045,-3.4 ; 0.85,0.925 0.85,0.1 2.585,-1.635 2.585,-3.4
Top Overlay:
  lines w0.254: -5.111,5.074 -10.826,5.074 -10.826,-1.149 9.748,-1.149 9.748,5.074 4.033,5.074
Keep-Out Layer:
  lines w0.15: -11.082,-5.022 -8.875,-5.022 -8.875,-6.957 3.975,-6.957 3.975,-5.022 4.855,-5.022 10.026,-5.022 10.026,6.1 -11.082,6.1 -11.082,-5.022
Mechanical 27:
  drawing of 434 lines, arcs and shapes, not listed
3D body "ZX80-B-5SA.stp": height 13.01, standoff -1.14, extent -10.808,-1.184 9.742,5.116